# Altium schematic symbol library jlcpcb_2025_04_inductors_extended_0402.schlib: 1396 symbols (part 5 of 8)
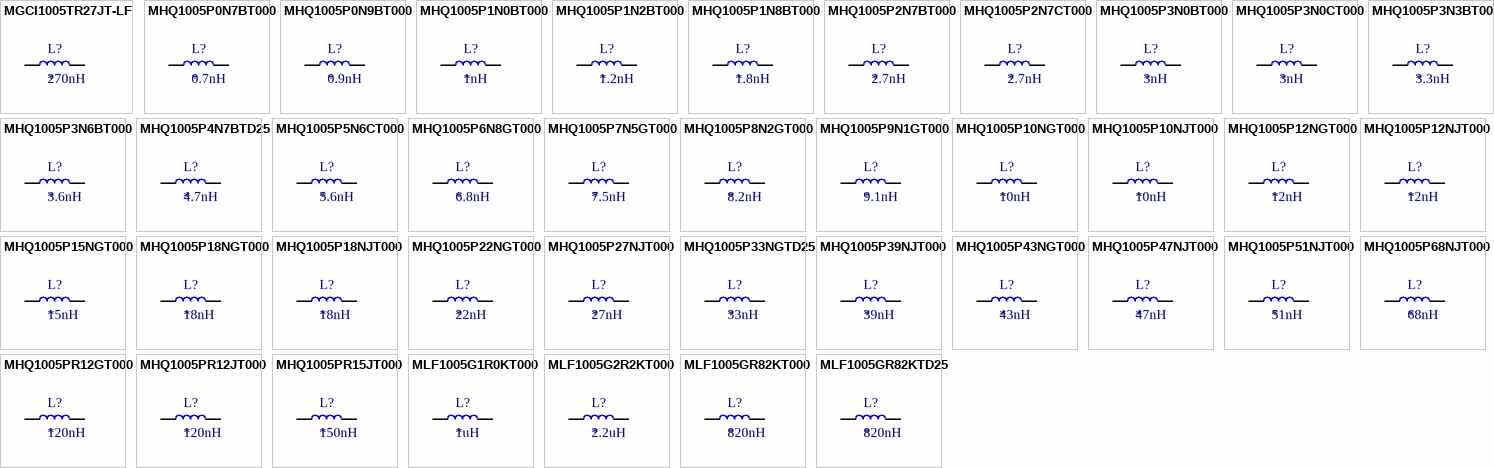
[diagram p38: symbols MGCI1005TR27JT-LF to MLF1005GR82KTD25]

## MLF1005G1R0KT000
designator L?  Inductance: 1uH
Inductor, 1uH, ±10%, 450mΩ, 40mA, SMD 0402; Manufacturer: TDK; Manufacturer Part Number: MLF1005G1R0KT000; Self-Resonant Frequency: 290MHz; Q Factor: 60@10MHz; Package Size: 0402; JLCPCB Basic Part: No; JLCPCB Part Number: C516791; Supplier 1: LCSC; Category: Inductors; Supplier Part Number 1: C516791; Tolerance: ±10%; Rated Current: 40mA; DC Resistance: 450mΩ; RoHS: Yes; ComponentLink1Description: Datasheet; ComponentLink1URL: https://wmsc.lcsc.com/wmsc/upload/file/pdf/v2/lcsc/2304140030_TDK-MLF1005G1R0KT000_C516791.pdf; ComponentLink2Description: JLCPCB Part URL; ComponentLink2URL: https://jlcpcb.com/partdetail/C516791; ComponentLink3Description: LCSC Part URL; ComponentLink3URL: https://lcsc.com/product-detail/Inductors-SMD_TDK-TDK-MLF1005G1R0KT000_C516791.html
footprint IND-0402 (0402 (1005M) Inductor)
pins: 1, 2

## MLF1005G2R2KT000
designator L?  Inductance: 2.2uH
Inductor, 2.2uH, ±10%, 990mΩ, 30mA, SMD 0402; Manufacturer: TDK; Manufacturer Part Number: MLF1005G2R2KT000; Self-Resonant Frequency: 80MHz; Q Factor: 60@10MHz; Package Size: 0402; JLCPCB Basic Part: No; JLCPCB Part Number: C524917; Supplier 1: LCSC; Category: Inductors; Supplier Part Number 1: C524917; Tolerance: ±10%; Rated Current: 30mA; DC Resistance: 990mΩ; RoHS: Yes; ComponentLink1Description: Datasheet; ComponentLink1URL: https://wmsc.lcsc.com/wmsc/upload/file/pdf/v2/lcsc/2304140030_TDK-MLF1005G2R2KT000_C524917.pdf; ComponentLink2Description: JLCPCB Part URL; ComponentLink2URL: https://jlcpcb.com/partdetail/C524917; ComponentLink3Description: LCSC Part URL; ComponentLink3URL: https://lcsc.com/product-detail/Inductors-SMD_TDK-TDK-MLF1005G2R2KT000_C524917.html
footprint IND-0402 (0402 (1005M) Inductor)
pins: 1, 2

## MLF1005GR82KT000
designator L?  Inductance: 820nH
Inductor, 820nH, ±10%, 430mΩ, 40mA, SMD 0402; Manufacturer: TDK; Manufacturer Part Number: MLF1005GR82KT000; Self-Resonant Frequency: 130MHz; Q Factor: 60@10MHz; Package Size: 0402; JLCPCB Basic Part: No; JLCPCB Part Number: C531403; Supplier 1: LCSC; Category: Inductors; Supplier Part Number 1: C531403; Tolerance: ±10%; Rated Current: 40mA; DC Resistance: 430mΩ; RoHS: Yes; ComponentLink1Description: Datasheet; ComponentLink1URL: https://wmsc.lcsc.com/wmsc/upload/file/pdf/v2/lcsc/2007091033_TDK-MLF1005GR82KT000_C531403.pdf; ComponentLink2Description: JLCPCB Part URL; ComponentLink2URL: https://jlcpcb.com/partdetail/C531403; ComponentLink3Description: LCSC Part URL; ComponentLink3URL: https://lcsc.com/product-detail/Inductors-SMD_TDK-TDK-MLF1005GR82KT000_C531403.html
footprint IND-0402 (0402 (1005M) Inductor)
pins: 1, 2

## MLF1005GR82KTD25
designator L?  Inductance: 820nH
Inductor, 820nH, ±10%, 430mΩ, 40mA, SMD 0402; Manufacturer: TDK; Manufacturer Part Number: MLF1005GR82KTD25; Self-Resonant Frequency: 320MHz; Q Factor: 60@10MHz; Package Size: 0402; JLCPCB Basic Part: No; JLCPCB Part Number: C165814; Supplier 1: LCSC; Category: Inductors; Supplier Part Number 1: C165814; Tolerance: ±10%; Rated Current: 40mA; DC Resistance: 430mΩ; RoHS: Yes; ComponentLink1Description: Datasheet; ComponentLink1URL: https://wmsc.lcsc.com/wmsc/upload/file/pdf/v2/lcsc/1809051019_TDK-MLF1005GR82KTD25_C165814.pdf; ComponentLink2Description: JLCPCB Part URL; ComponentLink2URL: https://jlcpcb.com/partdetail/C165814; ComponentLink3Description: LCSC Part URL; ComponentLink3URL: https://lcsc.com/product-detail/Inductors-SMD_TDK-TDK-MLF1005GR82KTD25_C165814.html
footprint IND-0402 (0402 (1005M) Inductor)
pins: 1, 2

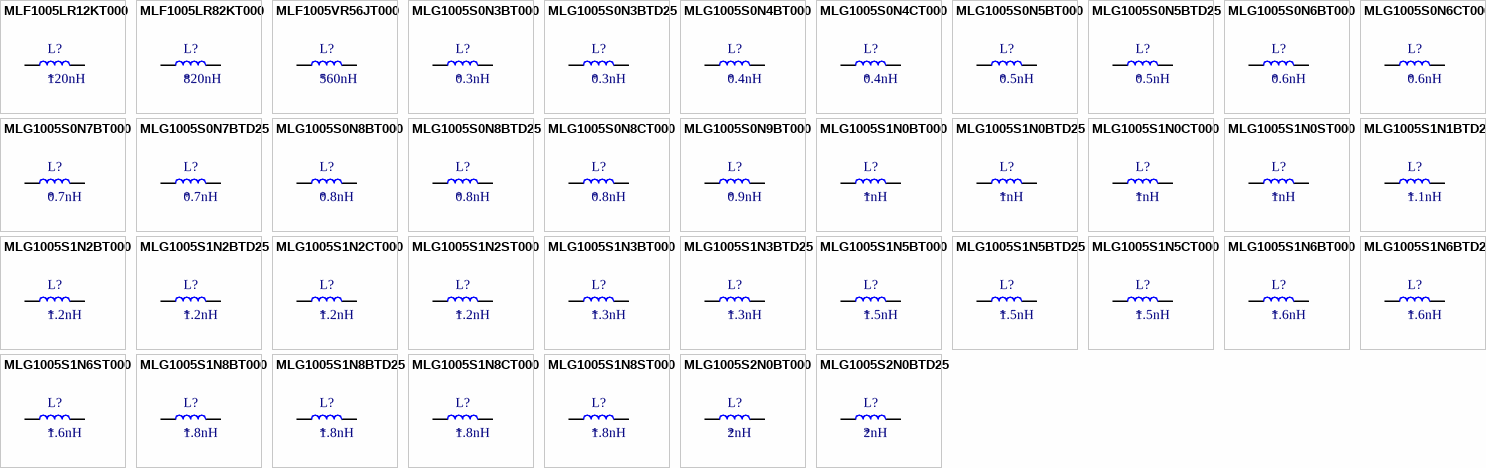
[diagram p19: symbols MLF1005LR12KT000 to MLG1005S2N0BTD25]

## MLF1005LR12KT000
designator L?  Inductance: 120nH
Inductor, 120nH, ±10%, 590mΩ, 140mA, SMD 0402; Manufacturer: TDK; Manufacturer Part Number: MLF1005LR12KT000; Q Factor: 10@25MHz; Package Size: 0402; JLCPCB Basic Part: No; JLCPCB Part Number: C76729; Supplier 1: LCSC; Category: Inductors; Supplier Part Number 1: C76729; Tolerance: ±10%; Rated Current: 140mA; DC Resistance: 590mΩ; RoHS: Yes; ComponentLink1Description: Datasheet; ComponentLink1URL: https://wmsc.lcsc.com/wmsc/upload/file/pdf/v2/lcsc/1809051318_TDK-MLF1005LR12KT000_C76729.pdf; ComponentLink2Description: JLCPCB Part URL; ComponentLink2URL: https://jlcpcb.com/partdetail/C76729; ComponentLink3Description: LCSC Part URL; ComponentLink3URL: https://lcsc.com/product-detail/Inductors-SMD_TDK-TDK-MLF1005LR12KT000_C76729.html
footprint IND-0402 (0402 (1005M) Inductor)
pins: 1, 2

## MLF1005LR82KT000
designator L?  Inductance: 820nH
Inductor, 820nH, ±10%, 590mΩ, 35mA, SMD 0402; Manufacturer: TDK; Manufacturer Part Number: MLF1005LR82KT000; Package Size: 0402; JLCPCB Basic Part: No; JLCPCB Part Number: C87452; Supplier 1: LCSC; Category: Inductors; Supplier Part Number 1: C87452; Tolerance: ±10%; Rated Current: 35mA; DC Resistance: 590mΩ; RoHS: Yes; ComponentLink1Description: Datasheet; ComponentLink1URL: https://wmsc.lcsc.com/wmsc/upload/file/pdf/v2/lcsc/1809051312_TDK-MLF1005LR82KT000_C87452.pdf; ComponentLink2Description: JLCPCB Part URL; ComponentLink2URL: https://jlcpcb.com/partdetail/C87452; ComponentLink3Description: LCSC Part URL; ComponentLink3URL: https://lcsc.com/product-detail/Inductors-SMD_TDK-TDK-MLF1005LR82KT000_C87452.html
footprint IND-0402 (0402 (1005M) Inductor)
pins: 1, 2

## MLF1005VR56JT000
designator L?  Inductance: 560nH
Inductor, 560nH, ±5%, 1.35Ω, 120mA, SMD 0402; Manufacturer: TDK; Manufacturer Part Number: MLF1005VR56JT000; Self-Resonant Frequency: 170MHz; Q Factor: 15@25MHz; Package Size: 0402; JLCPCB Basic Part: No; JLCPCB Part Number: C695594; Supplier 1: LCSC; Category: Inductors; Supplier Part Number 1: C695594; Tolerance: ±5%; Rated Current: 120mA; DC Resistance: 1.35Ω; RoHS: Yes; ComponentLink1Description: Datasheet; ComponentLink1URL: https://wmsc.lcsc.com/wmsc/upload/file/pdf/v2/lcsc/2401221754_TDK-MLF1005VR56JT000_C695594.pdf; ComponentLink2Description: JLCPCB Part URL; ComponentLink2URL: https://jlcpcb.com/partdetail/C695594; ComponentLink3Description: LCSC Part URL; ComponentLink3URL: https://lcsc.com/product-detail/Inductors-SMD_TDK-TDK-MLF1005VR56JT000_C695594.html
footprint IND-0402 (0402 (1005M) Inductor)
pins: 1, 2

## MLG1005S0N3BT000
designator L?  Inductance: 0.3nH
Inductor, 0.3nH, 10mΩ, 1A, SMD 0402; Manufacturer: TDK; Manufacturer Part Number: MLG1005S0N3BT000; Self-Resonant Frequency: 10GHz; Package Size: 0402; JLCPCB Basic Part: No; JLCPCB Part Number: C275259; Supplier 1: LCSC; Category: Inductors; Supplier Part Number 1: C275259; Rated Current: 1A; DC Resistance: 10mΩ; RoHS: Yes; ComponentLink1Description: Datasheet; ComponentLink1URL: https://wmsc.lcsc.com/wmsc/upload/file/pdf/v2/lcsc/2304140030_TDK-MLG1005S0N3BT000_C275259.pdf; ComponentLink2Description: JLCPCB Part URL; ComponentLink2URL: https://jlcpcb.com/partdetail/C275259; ComponentLink3Description: LCSC Part URL; ComponentLink3URL: https://lcsc.com/product-detail/Inductors-SMD_TDK-TDK-MLG1005S0N3BT000_C275259.html
footprint IND-0402 (0402 (1005M) Inductor)
pins: 1, 2

## MLG1005S0N3BTD25
designator L?  Inductance: 0.3nH
Inductor, 0.3nH, 10mΩ, 1A, SMD 0402; Manufacturer: TDK; Manufacturer Part Number: MLG1005S0N3BTD25; Self-Resonant Frequency: 20GHz; Package Size: 0402; JLCPCB Basic Part: No; JLCPCB Part Number: C404605; Supplier 1: LCSC; Category: Inductors; Supplier Part Number 1: C404605; Rated Current: 1A; DC Resistance: 10mΩ; RoHS: Yes; ComponentLink1Description: Datasheet; ComponentLink1URL: https://wmsc.lcsc.com/wmsc/upload/file/pdf/v2/lcsc/2304140030_TDK-MLG1005S0N3BTD25_C404605.pdf; ComponentLink2Description: JLCPCB Part URL; ComponentLink2URL: https://jlcpcb.com/partdetail/C404605; ComponentLink3Description: LCSC Part URL; ComponentLink3URL: https://lcsc.com/product-detail/Inductors-SMD_TDK-TDK-MLG1005S0N3BTD25_C404605.html
footprint IND-0402 (0402 (1005M) Inductor)
pins: 1, 2

## MLG1005S0N4BT000
designator L?  Inductance: 0.4nH
Inductor, 0.4nH, 10mΩ, 1A, SMD 0402; Manufacturer: TDK; Manufacturer Part Number: MLG1005S0N4BT000; Self-Resonant Frequency: 20GHz; Package Size: 0402; JLCPCB Basic Part: No; JLCPCB Part Number: C275260; Supplier 1: LCSC; Category: Inductors; Supplier Part Number 1: C275260; Rated Current: 1A; DC Resistance: 10mΩ; RoHS: Yes; ComponentLink1Description: Datasheet; ComponentLink1URL: https://wmsc.lcsc.com/wmsc/upload/file/pdf/v2/lcsc/2304140030_TDK-MLG1005S0N4BT000_C275260.pdf; ComponentLink2Description: JLCPCB Part URL; ComponentLink2URL: https://jlcpcb.com/partdetail/C275260; ComponentLink3Description: LCSC Part URL; ComponentLink3URL: https://lcsc.com/product-detail/Inductors-SMD_TDK-TDK-MLG1005S0N4BT000_C275260.html
footprint IND-0402 (0402 (1005M) Inductor)
pins: 1, 2

## MLG1005S0N4CT000
designator L?  Inductance: 0.4nH
Inductor, 0.4nH, 10mΩ, 1A, SMD 0402; Manufacturer: TDK; Manufacturer Part Number: MLG1005S0N4CT000; Self-Resonant Frequency: 20GHz; Package Size: 0402; JLCPCB Basic Part: No; JLCPCB Part Number: C275261; Supplier 1: LCSC; Category: Inductors; Supplier Part Number 1: C275261; Rated Current: 1A; DC Resistance: 10mΩ; RoHS: Yes; ComponentLink1Description: Datasheet; ComponentLink1URL: https://wmsc.lcsc.com/wmsc/upload/file/pdf/v2/lcsc/2304140030_TDK-MLG1005S0N4CT000_C275261.pdf; ComponentLink2Description: JLCPCB Part URL; ComponentLink2URL: https://jlcpcb.com/partdetail/C275261; ComponentLink3Description: LCSC Part URL; ComponentLink3URL: https://lcsc.com/product-detail/Inductors-SMD_TDK-TDK-MLG1005S0N4CT000_C275261.html
footprint IND-0402 (0402 (1005M) Inductor)
pins: 1, 2

## MLG1005S0N5BT000
designator L?  Inductance: 0.5nH
Inductor, 0.5nH, 10mΩ, 1A, SMD 0402; Manufacturer: TDK; Manufacturer Part Number: MLG1005S0N5BT000; Self-Resonant Frequency: 10GHz; Package Size: 0402; JLCPCB Basic Part: No; JLCPCB Part Number: C87528; Supplier 1: LCSC; Category: Inductors; Supplier Part Number 1: C87528; Rated Current: 1A; DC Resistance: 10mΩ; RoHS: Yes; ComponentLink1Description: Datasheet; ComponentLink1URL: https://wmsc.lcsc.com/wmsc/upload/file/pdf/v2/lcsc/2304140030_TDK-MLG1005S0N5BT000_C87528.pdf; ComponentLink2Description: JLCPCB Part URL; ComponentLink2URL: https://jlcpcb.com/partdetail/C87528; ComponentLink3Description: LCSC Part URL; ComponentLink3URL: https://lcsc.com/product-detail/Inductors-SMD_TDK-TDK-MLG1005S0N5BT000_C87528.html
footprint IND-0402 (0402 (1005M) Inductor)
pins: 1, 2

## MLG1005S0N5BTD25
designator L?  Inductance: 0.5nH
Inductor, 0.5nH, 10mΩ, 1A, SMD 0402; Manufacturer: TDK; Manufacturer Part Number: MLG1005S0N5BTD25; Self-Resonant Frequency: 10GHz; Package Size: 0402; JLCPCB Basic Part: No; JLCPCB Part Number: C404607; Supplier 1: LCSC; Category: Inductors; Supplier Part Number 1: C404607; Rated Current: 1A; DC Resistance: 10mΩ; RoHS: Yes; ComponentLink1Description: Datasheet; ComponentLink1URL: https://wmsc.lcsc.com/wmsc/upload/file/pdf/v2/lcsc/2304140030_TDK-MLG1005S0N5BTD25_C404607.pdf; ComponentLink2Description: JLCPCB Part URL; ComponentLink2URL: https://jlcpcb.com/partdetail/C404607; ComponentLink3Description: LCSC Part URL; ComponentLink3URL: https://lcsc.com/product-detail/Inductors-SMD_TDK-TDK-MLG1005S0N5BTD25_C404607.html
footprint IND-0402 (0402 (1005M) Inductor)
pins: 1, 2

## MLG1005S0N6BT000
designator L?  Inductance: 0.6nH
Inductor, 0.6nH, 10mΩ, 1A, SMD 0402; Manufacturer: TDK; Manufacturer Part Number: MLG1005S0N6BT000; Self-Resonant Frequency: 10GHz; Package Size: 0402; JLCPCB Basic Part: No; JLCPCB Part Number: C76758; Supplier 1: LCSC; Category: Inductors; Supplier Part Number 1: C76758; Rated Current: 1A; DC Resistance: 10mΩ; RoHS: Yes; ComponentLink1Description: Datasheet; ComponentLink1URL: https://wmsc.lcsc.com/wmsc/upload/file/pdf/v2/lcsc/2304140030_TDK-MLG1005S0N6BT000_C76758.pdf; ComponentLink2Description: JLCPCB Part URL; ComponentLink2URL: https://jlcpcb.com/partdetail/C76758; ComponentLink3Description: LCSC Part URL; ComponentLink3URL: https://lcsc.com/product-detail/Inductors-SMD_TDK-TDK-MLG1005S0N6BT000_C76758.html
footprint IND-0402 (0402 (1005M) Inductor)
pins: 1, 2

## MLG1005S0N6CT000
designator L?  Inductance: 0.6nH
Inductor, 0.6nH, 10mΩ, 1A, SMD 0402; Manufacturer: TDK; Manufacturer Part Number: MLG1005S0N6CT000; Self-Resonant Frequency: 20GHz; Package Size: 0402; JLCPCB Basic Part: No; JLCPCB Part Number: C95042; Supplier 1: LCSC; Category: Inductors; Supplier Part Number 1: C95042; Rated Current: 1A; DC Resistance: 10mΩ; RoHS: Yes; ComponentLink1Description: Datasheet; ComponentLink1URL: https://wmsc.lcsc.com/wmsc/upload/file/pdf/v2/lcsc/2304140030_TDK-MLG1005S0N6CT000_C95042.pdf; ComponentLink2Description: JLCPCB Part URL; ComponentLink2URL: https://jlcpcb.com/partdetail/C95042; ComponentLink3Description: LCSC Part URL; ComponentLink3URL: https://lcsc.com/product-detail/Inductors-SMD_TDK-TDK-MLG1005S0N6CT000_C95042.html
footprint IND-0402 (0402 (1005M) Inductor)
pins: 1, 2

## MLG1005S0N7BT000
designator L?  Inductance: 0.7nH
Inductor, 0.7nH, 20mΩ, 1A, SMD 0402; Manufacturer: TDK; Manufacturer Part Number: MLG1005S0N7BT000; Self-Resonant Frequency: 10GHz; Package Size: 0402; JLCPCB Basic Part: No; JLCPCB Part Number: C275262; Supplier 1: LCSC; Category: Inductors; Supplier Part Number 1: C275262; Rated Current: 1A; DC Resistance: 20mΩ; RoHS: Yes; ComponentLink1Description: Datasheet; ComponentLink1URL: https://wmsc.lcsc.com/wmsc/upload/file/pdf/v2/lcsc/2304140030_TDK-MLG1005S0N7BT000_C275262.pdf; ComponentLink2Description: JLCPCB Part URL; ComponentLink2URL: https://jlcpcb.com/partdetail/C275262; ComponentLink3Description: LCSC Part URL; ComponentLink3URL: https://lcsc.com/product-detail/Inductors-SMD_TDK-TDK-MLG1005S0N7BT000_C275262.html
footprint IND-0402 (0402 (1005M) Inductor)
pins: 1, 2

## MLG1005S0N7BTD25
designator L?  Inductance: 0.7nH
Inductor, 0.7nH, 20mΩ, 1A, SMD 0402; Manufacturer: TDK; Manufacturer Part Number: MLG1005S0N7BTD25; Self-Resonant Frequency: 18.7GHz; Package Size: 0402; JLCPCB Basic Part: No; JLCPCB Part Number: C404609; Supplier 1: LCSC; Category: Inductors; Supplier Part Number 1: C404609; Rated Current: 1A; DC Resistance: 20mΩ; RoHS: Yes; ComponentLink1Description: Datasheet; ComponentLink1URL: https://wmsc.lcsc.com/wmsc/upload/file/pdf/v2/lcsc/2304140030_TDK-MLG1005S0N7BTD25_C404609.pdf; ComponentLink2Description: JLCPCB Part URL; ComponentLink2URL: https://jlcpcb.com/partdetail/C404609; ComponentLink3Description: LCSC Part URL; ComponentLink3URL: https://lcsc.com/product-detail/Inductors-SMD_TDK-TDK-MLG1005S0N7BTD25_C404609.html
footprint IND-0402 (0402 (1005M) Inductor)
pins: 1, 2

## MLG1005S0N8BT000
designator L?  Inductance: 0.8nH
Inductor, 0.8nH, 20mΩ, 1A, SMD 0402; Manufacturer: TDK; Manufacturer Part Number: MLG1005S0N8BT000; Self-Resonant Frequency: 10GHz; Package Size: 0402; JLCPCB Basic Part: No; JLCPCB Part Number: C76759; Supplier 1: LCSC; Category: Inductors; Supplier Part Number 1: C76759; Rated Current: 1A; DC Resistance: 20mΩ; RoHS: Yes; ComponentLink1Description: Datasheet; ComponentLink1URL: https://wmsc.lcsc.com/wmsc/upload/file/pdf/v2/lcsc/2304140030_TDK-MLG1005S0N8BT000_C76759.pdf; ComponentLink2Description: JLCPCB Part URL; ComponentLink2URL: https://jlcpcb.com/partdetail/C76759; ComponentLink3Description: LCSC Part URL; ComponentLink3URL: https://lcsc.com/product-detail/Inductors-SMD_TDK-TDK-MLG1005S0N8BT000_C76759.html
footprint IND-0402 (0402 (1005M) Inductor)
pins: 1, 2

## MLG1005S0N8BTD25
designator L?  Inductance: 0.8nH
Inductor, 0.8nH, 20mΩ, 1A, SMD 0402; Manufacturer: TDK; Manufacturer Part Number: MLG1005S0N8BTD25; Self-Resonant Frequency: 16.4GHz; Package Size: 0402; JLCPCB Basic Part: No; JLCPCB Part Number: C404610; Supplier 1: LCSC; Category: Inductors; Supplier Part Number 1: C404610; Rated Current: 1A; DC Resistance: 20mΩ; RoHS: Yes; ComponentLink1Description: Datasheet; ComponentLink1URL: https://wmsc.lcsc.com/wmsc/upload/file/pdf/v2/lcsc/2304140030_TDK-MLG1005S0N8BTD25_C404610.pdf; ComponentLink2Description: JLCPCB Part URL; ComponentLink2URL: https://jlcpcb.com/partdetail/C404610; ComponentLink3Description: LCSC Part URL; ComponentLink3URL: https://lcsc.com/product-detail/Inductors-SMD_TDK-TDK-MLG1005S0N8BTD25_C404610.html
footprint IND-0402 (0402 (1005M) Inductor)
pins: 1, 2

## MLG1005S0N8CT000
designator L?  Inductance: 0.8nH
Inductor, 0.8nH, 20mΩ, 1A, SMD 0402; Manufacturer: TDK; Manufacturer Part Number: MLG1005S0N8CT000; Self-Resonant Frequency: 16.4GHz; Package Size: 0402; JLCPCB Basic Part: No; JLCPCB Part Number: C95043; Supplier 1: LCSC; Category: Inductors; Supplier Part Number 1: C95043; Rated Current: 1A; DC Resistance: 20mΩ; RoHS: Yes; ComponentLink1Description: Datasheet; ComponentLink1URL: https://wmsc.lcsc.com/wmsc/upload/file/pdf/v2/lcsc/2304140030_TDK-MLG1005S0N8CT000_C95043.pdf; ComponentLink2Description: JLCPCB Part URL; ComponentLink2URL: https://jlcpcb.com/partdetail/C95043; ComponentLink3Description: LCSC Part URL; ComponentLink3URL: https://lcsc.com/product-detail/Inductors-SMD_TDK-TDK-MLG1005S0N8CT000_C95043.html
footprint IND-0402 (0402 (1005M) Inductor)
pins: 1, 2

## MLG1005S0N9BT000
designator L?  Inductance: 0.9nH
Inductor, 0.9nH, 40mΩ, 1A, SMD 0402; Manufacturer: TDK; Manufacturer Part Number: MLG1005S0N9BT000; Self-Resonant Frequency: 17.7GHz; Package Size: 0402; JLCPCB Basic Part: No; JLCPCB Part Number: C275263; Supplier 1: LCSC; Category: Inductors; Supplier Part Number 1: C275263; Rated Current: 1A; DC Resistance: 40mΩ; RoHS: Yes; ComponentLink1Description: Datasheet; ComponentLink1URL: https://wmsc.lcsc.com/wmsc/upload/file/pdf/v2/lcsc/2201242230_TDK-MLG1005S0N9BT000_C275263.pdf; ComponentLink2Description: JLCPCB Part URL; ComponentLink2URL: https://jlcpcb.com/partdetail/C275263; ComponentLink3Description: LCSC Part URL; ComponentLink3URL: https://lcsc.com/product-detail/Inductors-SMD_TDK-TDK-MLG1005S0N9BT000_C275263.html
footprint IND-0402 (0402 (1005M) Inductor)
pins: 1, 2

## MLG1005S1N0BT000
designator L?  Inductance: 1nH
Inductor, 1nH, 40mΩ, 1A, SMD 0402; Manufacturer: TDK; Manufacturer Part Number: MLG1005S1N0BT000; Self-Resonant Frequency: 13.8GHz; Q Factor: 7@100MHz; Package Size: 0402; JLCPCB Basic Part: No; JLCPCB Part Number: C76765; Supplier 1: LCSC; Category: Inductors; Supplier Part Number 1: C76765; Rated Current: 1A; DC Resistance: 40mΩ; RoHS: Yes; ComponentLink1Description: Datasheet; ComponentLink1URL: https://wmsc.lcsc.com/wmsc/upload/file/pdf/v2/lcsc/2304140030_TDK-MLG1005S1N0BT000_C76765.pdf; ComponentLink2Description: JLCPCB Part URL; ComponentLink2URL: https://jlcpcb.com/partdetail/C76765; ComponentLink3Description: LCSC Part URL; ComponentLink3URL: https://lcsc.com/product-detail/Inductors-SMD_TDK-TDK-MLG1005S1N0BT000_C76765.html
footprint IND-0402 (0402 (1005M) Inductor)
pins: 1, 2

## MLG1005S1N0BTD25
designator L?  Inductance: 1nH
Inductor, 1nH, 40mΩ, 1A, SMD 0402; Manufacturer: TDK; Manufacturer Part Number: MLG1005S1N0BTD25; Self-Resonant Frequency: 13.8GHz; Q Factor: 7@100MHz; Package Size: 0402; JLCPCB Basic Part: No; JLCPCB Part Number: C404612; Supplier 1: LCSC; Category: Inductors; Supplier Part Number 1: C404612; Rated Current: 1A; DC Resistance: 40mΩ; RoHS: Yes; ComponentLink1Description: Datasheet; ComponentLink1URL: https://wmsc.lcsc.com/wmsc/upload/file/pdf/v2/lcsc/2304140030_TDK-MLG1005S1N0BTD25_C404612.pdf; ComponentLink2Description: JLCPCB Part URL; ComponentLink2URL: https://jlcpcb.com/partdetail/C404612; ComponentLink3Description: LCSC Part URL; ComponentLink3URL: https://lcsc.com/product-detail/Inductors-SMD_TDK-TDK-MLG1005S1N0BTD25_C404612.html
footprint IND-0402 (0402 (1005M) Inductor)
pins: 1, 2

## MLG1005S1N0CT000
designator L?  Inductance: 1nH
Inductor, 1nH, 40mΩ, 1A, SMD 0402; Manufacturer: TDK; Manufacturer Part Number: MLG1005S1N0CT000; Self-Resonant Frequency: 13.8GHz; Q Factor: 7@100MHz; Package Size: 0402; JLCPCB Basic Part: No; JLCPCB Part Number: C307722; Supplier 1: LCSC; Category: Inductors; Supplier Part Number 1: C307722; Rated Current: 1A; DC Resistance: 40mΩ; RoHS: Yes; ComponentLink1Description: Datasheet; ComponentLink1URL: https://wmsc.lcsc.com/wmsc/upload/file/pdf/v2/lcsc/2304140030_TDK-MLG1005S1N0CT000_C307722.pdf; ComponentLink2Description: JLCPCB Part URL; ComponentLink2URL: https://jlcpcb.com/partdetail/C307722; ComponentLink3Description: LCSC Part URL; ComponentLink3URL: https://lcsc.com/product-detail/Inductors-SMD_TDK-TDK-MLG1005S1N0CT000_C307722.html
footprint IND-0402 (0402 (1005M) Inductor)
pins: 1, 2

## MLG1005S1N0ST000
designator L?  Inductance: 1nH
Inductor, 1nH, 40mΩ, 1A, SMD 0402; Manufacturer: TDK; Manufacturer Part Number: MLG1005S1N0ST000; Self-Resonant Frequency: 10GHz; Q Factor: 7@100MHz; Package Size: 0402; JLCPCB Basic Part: No; JLCPCB Part Number: C76766; Supplier 1: LCSC; Category: Inductors; Supplier Part Number 1: C76766; Rated Current: 1A; DC Resistance: 40mΩ; RoHS: Yes; ComponentLink1Description: Datasheet; ComponentLink1URL: https://wmsc.lcsc.com/wmsc/upload/file/pdf/v2/lcsc/2304140030_TDK-MLG1005S1N0ST000_C76766.pdf; ComponentLink2Description: JLCPCB Part URL; ComponentLink2URL: https://jlcpcb.com/partdetail/C76766; ComponentLink3Description: LCSC Part URL; ComponentLink3URL: https://lcsc.com/product-detail/Inductors-SMD_TDK-TDK-MLG1005S1N0ST000_C76766.html
footprint IND-0402 (0402 (1005M) Inductor)
pins: 1, 2

## MLG1005S1N1BTD25
designator L?  Inductance: 1.1nH
Inductor, 1.1nH, 30mΩ, 1A, SMD 0402; Manufacturer: TDK; Manufacturer Part Number: MLG1005S1N1BTD25; Self-Resonant Frequency: 19.3GHz; Q Factor: 7@100MHz; Package Size: 0402; JLCPCB Basic Part: No; JLCPCB Part Number: C404613; Supplier 1: LCSC; Category: Inductors; Supplier Part Number 1: C404613; Rated Current: 1A; DC Resistance: 30mΩ; RoHS: Yes; ComponentLink1Description: Datasheet; ComponentLink1URL: https://wmsc.lcsc.com/wmsc/upload/file/pdf/v2/lcsc/2304140030_TDK-MLG1005S1N1BTD25_C404613.pdf; ComponentLink2Description: JLCPCB Part URL; ComponentLink2URL: https://jlcpcb.com/partdetail/C404613; ComponentLink3Description: LCSC Part URL; ComponentLink3URL: https://lcsc.com/product-detail/Inductors-SMD_TDK-TDK-MLG1005S1N1BTD25_C404613.html
footprint IND-0402 (0402 (1005M) Inductor)
pins: 1, 2

## MLG1005S1N2BT000
designator L?  Inductance: 1.2nH
Inductor, 1.2nH, 40mΩ, 1A, SMD 0402; Manufacturer: TDK; Manufacturer Part Number: MLG1005S1N2BT000; Self-Resonant Frequency: 10GHz; Q Factor: 7@100MHz; Package Size: 0402; JLCPCB Basic Part: No; JLCPCB Part Number: C275269; Supplier 1: LCSC; Category: Inductors; Supplier Part Number 1: C275269; Rated Current: 1A; DC Resistance: 40mΩ; RoHS: Yes; ComponentLink1Description: Datasheet; ComponentLink1URL: https://wmsc.lcsc.com/wmsc/upload/file/pdf/v2/lcsc/2304140030_TDK-MLG1005S1N2BT000_C275269.pdf; ComponentLink2Description: JLCPCB Part URL; ComponentLink2URL: https://jlcpcb.com/partdetail/C275269; ComponentLink3Description: LCSC Part URL; ComponentLink3URL: https://lcsc.com/product-detail/Inductors-SMD_TDK-TDK-MLG1005S1N2BT000_C275269.html
footprint IND-0402 (0402 (1005M) Inductor)
pins: 1, 2

## MLG1005S1N2BTD25
designator L?  Inductance: 1.2nH
Inductor, 1.2nH, 40mΩ, 1A, SMD 0402; Manufacturer: TDK; Manufacturer Part Number: MLG1005S1N2BTD25; Self-Resonant Frequency: 11.6GHz; Q Factor: 7@100MHz; Package Size: 0402; JLCPCB Basic Part: No; JLCPCB Part Number: C404614; Supplier 1: LCSC; Category: Inductors; Supplier Part Number 1: C404614; Rated Current: 1A; DC Resistance: 40mΩ; RoHS: Yes; ComponentLink1Description: Datasheet; ComponentLink1URL: https://wmsc.lcsc.com/wmsc/upload/file/pdf/v2/lcsc/2304140030_TDK-MLG1005S1N2BTD25_C404614.pdf; ComponentLink2Description: JLCPCB Part URL; ComponentLink2URL: https://jlcpcb.com/partdetail/C404614; ComponentLink3Description: LCSC Part URL; ComponentLink3URL: https://lcsc.com/product-detail/Inductors-SMD_TDK-TDK-MLG1005S1N2BTD25_C404614.html
footprint IND-0402 (0402 (1005M) Inductor)
pins: 1, 2

## MLG1005S1N2CT000
designator L?  Inductance: 1.2nH
Inductor, 1.2nH, 40mΩ, 1A, SMD 0402; Manufacturer: TDK; Manufacturer Part Number: MLG1005S1N2CT000; Self-Resonant Frequency: 11.6GHz; Q Factor: 7@100MHz; Package Size: 0402; JLCPCB Basic Part: No; JLCPCB Part Number: C98766; Supplier 1: LCSC; Category: Inductors; Supplier Part Number 1: C98766; Rated Current: 1A; DC Resistance: 40mΩ; RoHS: Yes; ComponentLink1Description: Datasheet; ComponentLink1URL: https://wmsc.lcsc.com/wmsc/upload/file/pdf/v2/lcsc/2304140030_TDK-MLG1005S1N2CT000_C98766.pdf; ComponentLink2Description: JLCPCB Part URL; ComponentLink2URL: https://jlcpcb.com/partdetail/C98766; ComponentLink3Description: LCSC Part URL; ComponentLink3URL: https://lcsc.com/product-detail/Inductors-SMD_TDK-TDK-MLG1005S1N2CT000_C98766.html
footprint IND-0402 (0402 (1005M) Inductor)
pins: 1, 2

## MLG1005S1N2ST000
designator L?  Inductance: 1.2nH
Inductor, 1.2nH, 40mΩ, 1A, SMD 0402; Manufacturer: TDK; Manufacturer Part Number: MLG1005S1N2ST000; Self-Resonant Frequency: 10GHz; Q Factor: 7@100MHz; Package Size: 0402; JLCPCB Basic Part: No; JLCPCB Part Number: C98765; Supplier 1: LCSC; Category: Inductors; Supplier Part Number 1: C98765; Rated Current: 1A; DC Resistance: 40mΩ; RoHS: Yes; ComponentLink1Description: Datasheet; ComponentLink1URL: https://wmsc.lcsc.com/wmsc/upload/file/pdf/v2/lcsc/2304140030_TDK-MLG1005S1N2ST000_C98765.pdf; ComponentLink2Description: JLCPCB Part URL; ComponentLink2URL: https://jlcpcb.com/partdetail/C98765; ComponentLink3Description: LCSC Part URL; ComponentLink3URL: https://lcsc.com/product-detail/Inductors-SMD_TDK-TDK-MLG1005S1N2ST000_C98765.html
footprint IND-0402 (0402 (1005M) Inductor)
pins: 1, 2

## MLG1005S1N3BT000
designator L?  Inductance: 1.3nH
Inductor, 1.3nH, 40mΩ, 1A, SMD 0402; Manufacturer: TDK; Manufacturer Part Number: MLG1005S1N3BT000; Self-Resonant Frequency: 8GHz; Q Factor: 7@100MHz; Package Size: 0402; JLCPCB Basic Part: No; JLCPCB Part Number: C76767; Supplier 1: LCSC; Category: Inductors; Supplier Part Number 1: C76767; Rated Current: 1A; DC Resistance: 40mΩ; RoHS: Yes; ComponentLink1Description: Datasheet; ComponentLink1URL: https://wmsc.lcsc.com/wmsc/upload/file/pdf/v2/lcsc/2304140030_TDK-MLG1005S1N3BT000_C76767.pdf; ComponentLink2Description: JLCPCB Part URL; ComponentLink2URL: https://jlcpcb.com/partdetail/C76767; ComponentLink3Description: LCSC Part URL; ComponentLink3URL: https://lcsc.com/product-detail/Inductors-SMD_TDK-TDK-MLG1005S1N3BT000_C76767.html
footprint IND-0402 (0402 (1005M) Inductor)
pins: 1, 2

## MLG1005S1N3BTD25
designator L?  Inductance: 1.3nH
Inductor, 1.3nH, 40mΩ, 1A, SMD 0402; Manufacturer: TDK; Manufacturer Part Number: MLG1005S1N3BTD25; Self-Resonant Frequency: 11.7GHz; Q Factor: 7@100MHz; Package Size: 0402; JLCPCB Basic Part: No; JLCPCB Part Number: C404615; Supplier 1: LCSC; Category: Inductors; Supplier Part Number 1: C404615; Rated Current: 1A; DC Resistance: 40mΩ; RoHS: Yes; ComponentLink1Description: Datasheet; ComponentLink1URL: https://wmsc.lcsc.com/wmsc/upload/file/pdf/v2/lcsc/2304140030_TDK-MLG1005S1N3BTD25_C404615.pdf; ComponentLink2Description: JLCPCB Part URL; ComponentLink2URL: https://jlcpcb.com/partdetail/C404615; ComponentLink3Description: LCSC Part URL; ComponentLink3URL: https://lcsc.com/product-detail/Inductors-SMD_TDK-TDK-MLG1005S1N3BTD25_C404615.html
footprint IND-0402 (0402 (1005M) Inductor)
pins: 1, 2

## MLG1005S1N5BT000
designator L?  Inductance: 1.5nH
Inductor, 1.5nH, 60mΩ, 1A, SMD 0402; Manufacturer: TDK; Manufacturer Part Number: MLG1005S1N5BT000; Self-Resonant Frequency: 8GHz; Q Factor: 7@100MHz; Package Size: 0402; JLCPCB Basic Part: No; JLCPCB Part Number: C275270; Supplier 1: LCSC; Category: Inductors; Supplier Part Number 1: C275270; Rated Current: 1A; DC Resistance: 60mΩ; RoHS: Yes; ComponentLink1Description: Datasheet; ComponentLink1URL: https://wmsc.lcsc.com/wmsc/upload/file/pdf/v2/lcsc/2304140030_TDK-MLG1005S1N5BT000_C275270.pdf; ComponentLink2Description: JLCPCB Part URL; ComponentLink2URL: https://jlcpcb.com/partdetail/C275270; ComponentLink3Description: LCSC Part URL; ComponentLink3URL: https://lcsc.com/product-detail/Inductors-SMD_TDK-TDK-MLG1005S1N5BT000_C275270.html
footprint IND-0402 (0402 (1005M) Inductor)
pins: 1, 2

## MLG1005S1N5BTD25
designator L?  Inductance: 1.5nH
Inductor, 1.5nH, 60mΩ, 1A, SMD 0402; Manufacturer: TDK; Manufacturer Part Number: MLG1005S1N5BTD25; Self-Resonant Frequency: 8GHz; Q Factor: 7@100MHz; Package Size: 0402; JLCPCB Basic Part: No; JLCPCB Part Number: C360708; Supplier 1: LCSC; Category: Inductors; Supplier Part Number 1: C360708; Rated Current: 1A; DC Resistance: 60mΩ; RoHS: Yes; ComponentLink1Description: Datasheet; ComponentLink1URL: https://wmsc.lcsc.com/wmsc/upload/file/pdf/v2/lcsc/2304140030_TDK-MLG1005S1N5BTD25_C360708.pdf; ComponentLink2Description: JLCPCB Part URL; ComponentLink2URL: https://jlcpcb.com/partdetail/C360708; ComponentLink3Description: LCSC Part URL; ComponentLink3URL: https://lcsc.com/product-detail/Inductors-SMD_TDK-TDK-MLG1005S1N5BTD25_C360708.html
footprint IND-0402 (0402 (1005M) Inductor)
pins: 1, 2

## MLG1005S1N5CT000
designator L?  Inductance: 1.5nH
Inductor, 1.5nH, 60mΩ, 1A, SMD 0402; Manufacturer: TDK; Manufacturer Part Number: MLG1005S1N5CT000; Self-Resonant Frequency: 8GHz; Q Factor: 7@100MHz; Package Size: 0402; JLCPCB Basic Part: No; JLCPCB Part Number: C98764; Supplier 1: LCSC; Category: Inductors; Supplier Part Number 1: C98764; Rated Current: 1A; DC Resistance: 60mΩ; RoHS: Yes; ComponentLink1Description: Datasheet; ComponentLink1URL: https://wmsc.lcsc.com/wmsc/upload/file/pdf/v2/lcsc/2304140030_TDK-MLG1005S1N5CT000_C98764.pdf; ComponentLink2Description: JLCPCB Part URL; ComponentLink2URL: https://jlcpcb.com/partdetail/C98764; ComponentLink3Description: LCSC Part URL; ComponentLink3URL: https://lcsc.com/product-detail/Inductors-SMD_TDK-TDK-MLG1005S1N5CT000_C98764.html
footprint IND-0402 (0402 (1005M) Inductor)
pins: 1, 2

## MLG1005S1N6BT000
designator L?  Inductance: 1.6nH
Inductor, 1.6nH, 50mΩ, 1A, SMD 0402; Manufacturer: TDK; Manufacturer Part Number: MLG1005S1N6BT000; Self-Resonant Frequency: 7.5GHz; Q Factor: 7@100MHz; Package Size: 0402; JLCPCB Basic Part: No; JLCPCB Part Number: C87529; Supplier 1: LCSC; Category: Inductors; Supplier Part Number 1: C87529; Rated Current: 1A; DC Resistance: 50mΩ; RoHS: Yes; ComponentLink1Description: Datasheet; ComponentLink1URL: https://wmsc.lcsc.com/wmsc/upload/file/pdf/v2/lcsc/2304140030_TDK-MLG1005S1N6BT000_C87529.pdf; ComponentLink2Description: JLCPCB Part URL; ComponentLink2URL: https://jlcpcb.com/partdetail/C87529; ComponentLink3Description: LCSC Part URL; ComponentLink3URL: https://lcsc.com/product-detail/Inductors-SMD_TDK-TDK-MLG1005S1N6BT000_C87529.html
footprint IND-0402 (0402 (1005M) Inductor)
pins: 1, 2

## MLG1005S1N6BTD25
designator L?  Inductance: 1.6nH
Inductor, 1.6nH, 50mΩ, 1A, SMD 0402; Manufacturer: TDK; Manufacturer Part Number: MLG1005S1N6BTD25; Self-Resonant Frequency: 7.5GHz; Q Factor: 7@100MHz; Package Size: 0402; JLCPCB Basic Part: No; JLCPCB Part Number: C404616; Supplier 1: LCSC; Category: Inductors; Supplier Part Number 1: C404616; Rated Current: 1A; DC Resistance: 50mΩ; RoHS: Yes; ComponentLink1Description: Datasheet; ComponentLink1URL: https://wmsc.lcsc.com/wmsc/upload/file/pdf/v2/lcsc/2304140030_TDK-MLG1005S1N6BTD25_C404616.pdf; ComponentLink2Description: JLCPCB Part URL; ComponentLink2URL: https://jlcpcb.com/partdetail/C404616; ComponentLink3Description: LCSC Part URL; ComponentLink3URL: https://lcsc.com/product-detail/Inductors-SMD_TDK-TDK-MLG1005S1N6BTD25_C404616.html
footprint IND-0402 (0402 (1005M) Inductor)
pins: 1, 2

## MLG1005S1N6ST000
designator L?  Inductance: 1.6nH
Inductor, 1.6nH, 50mΩ, 1A, SMD 0402; Manufacturer: TDK; Manufacturer Part Number: MLG1005S1N6ST000; Self-Resonant Frequency: 7.5GHz; Q Factor: 7@100MHz; Package Size: 0402; JLCPCB Basic Part: No; JLCPCB Part Number: C307723; Supplier 1: LCSC; Category: Inductors; Supplier Part Number 1: C307723; Rated Current: 1A; DC Resistance: 50mΩ; RoHS: Yes; ComponentLink1Description: Datasheet; ComponentLink1URL: https://wmsc.lcsc.com/wmsc/upload/file/pdf/v2/lcsc/2304140030_TDK-MLG1005S1N6ST000_C307723.pdf; ComponentLink2Description: JLCPCB Part URL; ComponentLink2URL: https://jlcpcb.com/partdetail/C307723; ComponentLink3Description: LCSC Part URL; ComponentLink3URL: https://lcsc.com/product-detail/Inductors-SMD_TDK-TDK-MLG1005S1N6ST000_C307723.html
footprint IND-0402 (0402 (1005M) Inductor)
pins: 1, 2

## MLG1005S1N8BT000
designator L?  Inductance: 1.8nH
Inductor, 1.8nH, 60mΩ, 900mA, SMD 0402; Manufacturer: TDK; Manufacturer Part Number: MLG1005S1N8BT000; Self-Resonant Frequency: 10.3GHz; Q Factor: 7@100MHz; Package Size: 0402; JLCPCB Basic Part: No; JLCPCB Part Number: C87530; Supplier 1: LCSC; Category: Inductors; Supplier Part Number 1: C87530; Rated Current: 900mA; DC Resistance: 60mΩ; RoHS: Yes; ComponentLink1Description: Datasheet; ComponentLink1URL: https://wmsc.lcsc.com/wmsc/upload/file/pdf/v2/lcsc/2304140030_TDK-MLG1005S1N8BT000_C87530.pdf; ComponentLink2Description: JLCPCB Part URL; ComponentLink2URL: https://jlcpcb.com/partdetail/C87530; ComponentLink3Description: LCSC Part URL; ComponentLink3URL: https://lcsc.com/product-detail/Inductors-SMD_TDK-TDK-MLG1005S1N8BT000_C87530.html
footprint IND-0402 (0402 (1005M) Inductor)
pins: 1, 2

## MLG1005S1N8BTD25
designator L?  Inductance: 1.8nH
Inductor, 1.8nH, 60mΩ, 900mA, SMD 0402; Manufacturer: TDK; Manufacturer Part Number: MLG1005S1N8BTD25; Self-Resonant Frequency: 10.3GHz; Q Factor: 7@100MHz; Package Size: 0402; JLCPCB Basic Part: No; JLCPCB Part Number: C360709; Supplier 1: LCSC; Category: Inductors; Supplier Part Number 1: C360709; Rated Current: 900mA; DC Resistance: 60mΩ; RoHS: Yes; ComponentLink1Description: Datasheet; ComponentLink1URL: https://wmsc.lcsc.com/wmsc/upload/file/pdf/v2/lcsc/2304140030_TDK-MLG1005S1N8BTD25_C360709.pdf; ComponentLink2Description: JLCPCB Part URL; ComponentLink2URL: https://jlcpcb.com/partdetail/C360709; ComponentLink3Description: LCSC Part URL; ComponentLink3URL: https://lcsc.com/product-detail/Inductors-SMD_TDK-TDK-MLG1005S1N8BTD25_C360709.html
footprint IND-0402 (0402 (1005M) Inductor)
pins: 1, 2

## MLG1005S1N8CT000
designator L?  Inductance: 1.8nH
Inductor, 1.8nH, 60mΩ, 900mA, SMD 0402; Manufacturer: TDK; Manufacturer Part Number: MLG1005S1N8CT000; Self-Resonant Frequency: 10.3GHz; Q Factor: 7@100MHz; Package Size: 0402; JLCPCB Basic Part: No; JLCPCB Part Number: C275272; Supplier 1: LCSC; Category: Inductors; Supplier Part Number 1: C275272; Rated Current: 900mA; DC Resistance: 60mΩ; RoHS: Yes; ComponentLink1Description: Datasheet; ComponentLink1URL: https://wmsc.lcsc.com/wmsc/upload/file/pdf/v2/lcsc/2304140030_TDK-MLG1005S1N8CT000_C275272.pdf; ComponentLink2Description: JLCPCB Part URL; ComponentLink2URL: https://jlcpcb.com/partdetail/C275272; ComponentLink3Description: LCSC Part URL; ComponentLink3URL: https://lcsc.com/product-detail/Inductors-SMD_TDK-TDK-MLG1005S1N8CT000_C275272.html
footprint IND-0402 (0402 (1005M) Inductor)
pins: 1, 2

## MLG1005S1N8ST000
designator L?  Inductance: 1.8nH
Inductor, 1.8nH, 60mΩ, 900mA, SMD 0402; Manufacturer: TDK; Manufacturer Part Number: MLG1005S1N8ST000; Self-Resonant Frequency: 8GHz; Q Factor: 7@100MHz; Package Size: 0402; JLCPCB Basic Part: No; JLCPCB Part Number: C98761; Supplier 1: LCSC; Category: Inductors; Supplier Part Number 1: C98761; Rated Current: 900mA; DC Resistance: 60mΩ; RoHS: Yes; ComponentLink1Description: Datasheet; ComponentLink1URL: https://wmsc.lcsc.com/wmsc/upload/file/pdf/v2/lcsc/2304140030_TDK-MLG1005S1N8ST000_C98761.pdf; ComponentLink2Description: JLCPCB Part URL; ComponentLink2URL: https://jlcpcb.com/partdetail/C98761; ComponentLink3Description: LCSC Part URL; ComponentLink3URL: https://lcsc.com/product-detail/Inductors-SMD_TDK-TDK-MLG1005S1N8ST000_C98761.html
footprint IND-0402 (0402 (1005M) Inductor)
pins: 1, 2

## MLG1005S2N0BT000
designator L?  Inductance: 2nH
Inductor, 2nH, 70mΩ, 900mA, SMD 0402; Manufacturer: TDK; Manufacturer Part Number: MLG1005S2N0BT000; Self-Resonant Frequency: 7.5GHz; Q Factor: 7@100MHz; Package Size: 0402; JLCPCB Basic Part: No; JLCPCB Part Number: C76769; Supplier 1: LCSC; Category: Inductors; Supplier Part Number 1: C76769; Rated Current: 900mA; DC Resistance: 70mΩ; RoHS: Yes; ComponentLink1Description: Datasheet; ComponentLink1URL: https://wmsc.lcsc.com/wmsc/upload/file/pdf/v2/lcsc/2304140030_TDK-MLG1005S2N0BT000_C76769.pdf; ComponentLink2Description: JLCPCB Part URL; ComponentLink2URL: https://jlcpcb.com/partdetail/C76769; ComponentLink3Description: LCSC Part URL; ComponentLink3URL: https://lcsc.com/product-detail/Inductors-SMD_TDK-TDK-MLG1005S2N0BT000_C76769.html
footprint IND-0402 (0402 (1005M) Inductor)
pins: 1, 2

## MLG1005S2N0BTD25
designator L?  Inductance: 2nH
Inductor, 2nH, 70mΩ, 900mA, SMD 0402; Manufacturer: TDK; Manufacturer Part Number: MLG1005S2N0BTD25; Self-Resonant Frequency: 9.3GHz; Q Factor: 7@100MHz; Package Size: 0402; JLCPCB Basic Part: No; JLCPCB Part Number: C404617; Supplier 1: LCSC; Category: Inductors; Supplier Part Number 1: C404617; Rated Current: 900mA; DC Resistance: 70mΩ; RoHS: Yes; ComponentLink1Description: Datasheet; ComponentLink1URL: https://wmsc.lcsc.com/wmsc/upload/file/pdf/v2/lcsc/2304140030_TDK-MLG1005S2N0BTD25_C404617.pdf; ComponentLink2Description: JLCPCB Part URL; ComponentLink2URL: https://jlcpcb.com/partdetail/C404617; ComponentLink3Description: LCSC Part URL; ComponentLink3URL: https://lcsc.com/product-detail/Inductors-SMD_TDK-TDK-MLG1005S2N0BTD25_C404617.html
footprint IND-0402 (0402 (1005M) Inductor)
pins: 1, 2
